# Altium footprint library PCB贴片元件封装库.pcblib: 366 footprints (part 20 of 23)
Each footprint in its own frame and in the unit in brackets; x right, y up, seen from the top. Pads: shape width x height; smd on the part's side, far side on the other; paste and mask are expansions set on the pad; w line width, h text height; cw(c..) or ccw(c..) is an arc to the next point about the centre after c.
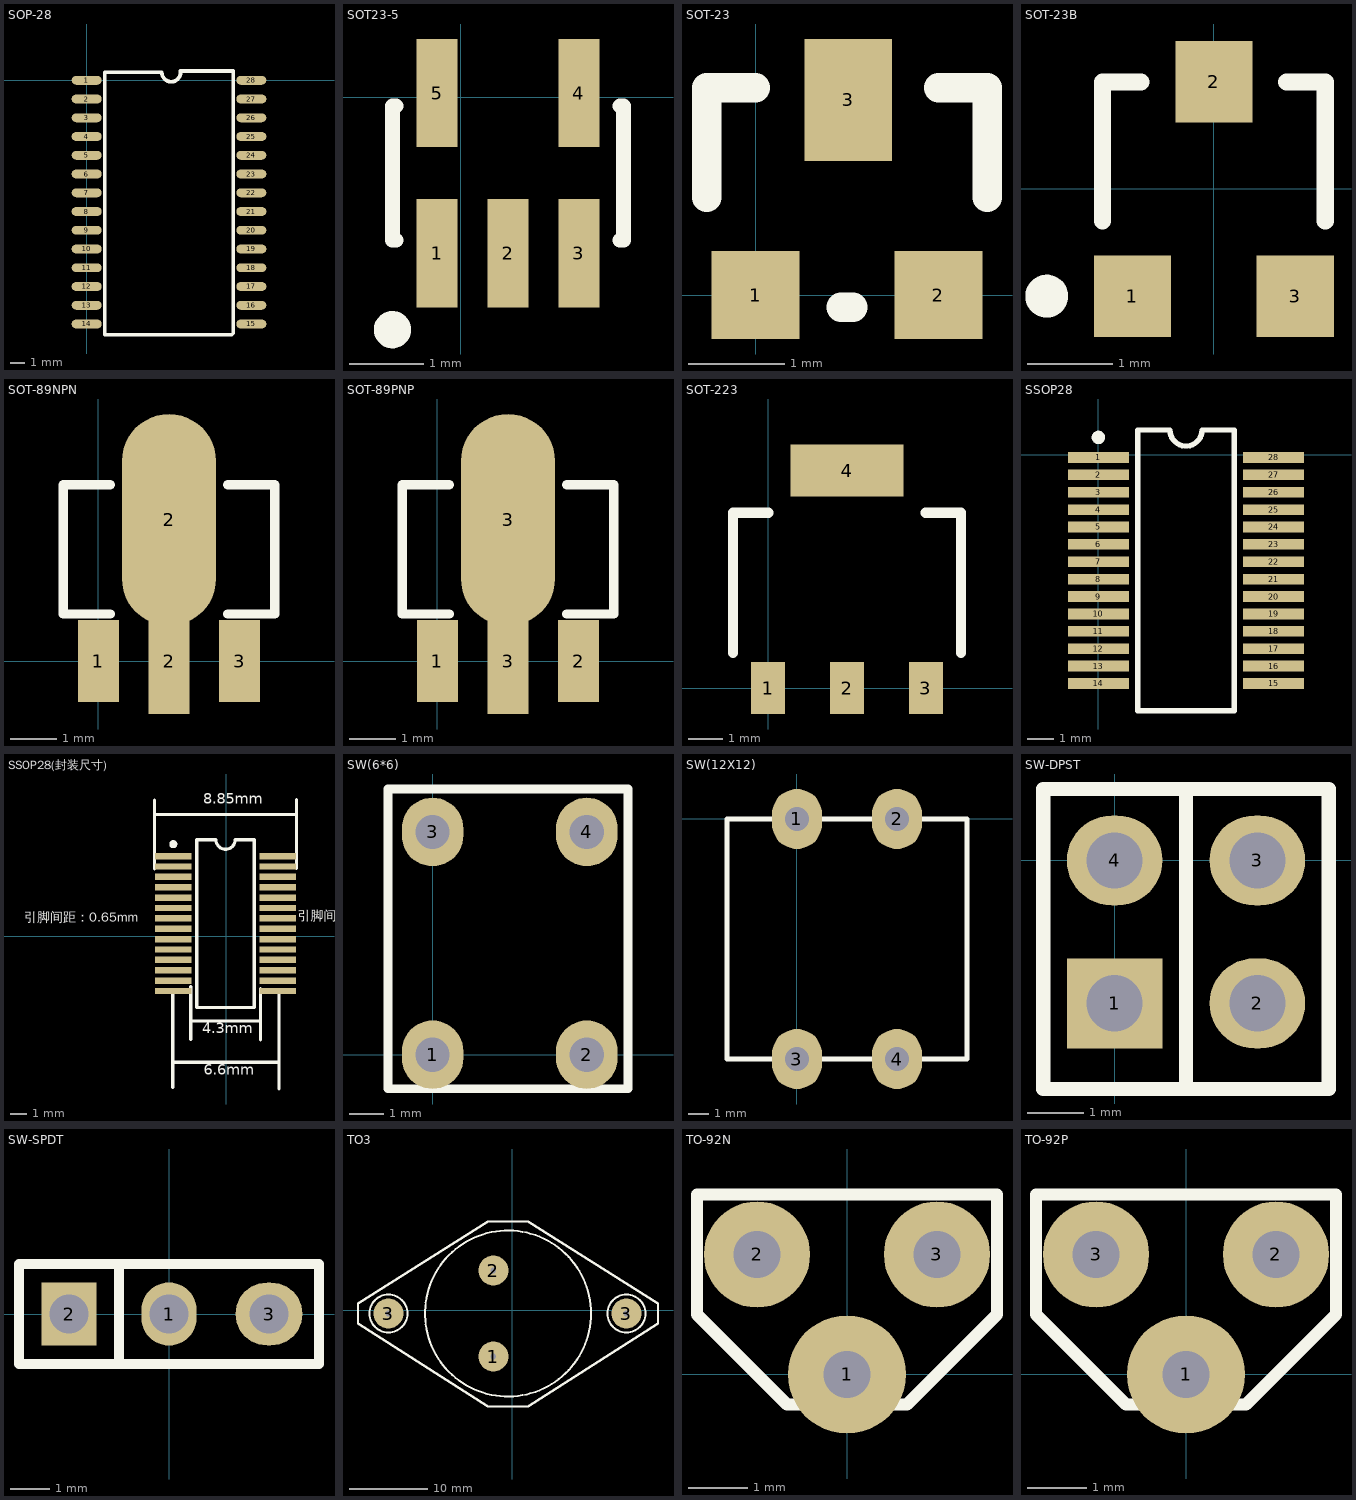
[diagram p19: the footprints below, top view; thin cyan lines are the x and y axes]

## SOP-28 [mil]
pads (28):
  oval 80x24 smd: 1(0,0) 2(0,-50) 3(0,-100) 4(0,-150) 5(0,-200) 6(0,-250) 7(0,-300) 8(0,-350) 9(0,-400) 10(0,-450) 11(0,-500) 12(0,-550) 13(0,-600) 14(0,-650) 15(439.29,-650) 16(439.29,-600) 17(439.29,-550) 18(439.29,-500) 19(439.29,-450) 20(439.29,-400) 21(439.29,-350) 22(439.29,-300) 23(439.29,-250) 24(439.29,-200) 25(439.29,-150) 26(439.29,-100) 27(439.29,-50) 28(439.29,0)
TopOverlay:
  lines w10: 196.61,21.06 48.19,21.06 48.19,-678.94 387.17,-678.94 ; 200.55,21.06 ccw(c225.55,21.06) 250.55,21.06 ; 250.55,25 391.1,25 391.1,-675

## SOT23-5 [mm]
pads (5):
  rect 0.55x1.45 smd: 1(-0.315,-2.091) 2(0.635,-2.091) 3(1.585,-2.091) 4(1.585,0.059) 5(-0.315,0.059)
TopOverlay:
  circle w0.25: c-0.915,-3.116 r0.125
  lines w0.2: -0.865,-1.916 -0.915,-1.916 -0.915,-0.116 -0.865,-0.116 ; 2.135,-1.916 2.185,-1.916 2.185,-0.116 2.135,-0.116

## SOT-23 [mil]
pads (3):
  rect 36x36 smd: 1(0,0) 2(75,0)
  rect 36x50 smd: 3(38,80)
TopOverlay:
  lines w12: -20,40 -20,85 0,85 ; 35,-5 40,-5 ; 75,85 95,85 95,40

## SOT-23B [mm] "SOT-23; 3 Leads; Body 3.0 x 2.6 mm, inc. leads (LxW max)"
height 1.1
pads (3):
  rect 0.9x0.95 smd: 1(-0.95,-1.25) 2(0,1.25) 3(0.95,-1.25)
TopOverlay:
  circle w0.25: c-1.95,-1.25 r0.125
  lines w0.2: -1.3,-0.375 -1.3,1.25 -0.85,1.25 ; 0.85,1.25 1.3,1.25 1.3,-0.375

## SOT-89NPN [mil]
pads (4):
  rect 35x70 smd: 1(0,0) 3(120,0)
  rect 35x90 smd: 2(60,0)
  oval 80x180 smd: 2(60,120)
TopOverlay:
  lines w8: 10,40 -30,40 -30,150 10,150 ; 110,40 150,40 150,150 110,150

## SOT-89PNP [mil]
pads (4):
  rect 35x70 smd: 1(0,0) 2(120,0)
  rect 35x90 smd: 3(60,0)
  oval 80x180 smd: 3(60,120)
TopOverlay:
  lines w8: 10,40 -30,40 -30,150 10,150 ; 110,40 150,40 150,150 110,150

## SOT-223 [mil]
pads (4):
  rect 39x59 smd: 1(0,0) 3(180,0)
  rect 38.98x59.05 smd: 2(90,0)
  rect 129.13x59 smd: 4(90,248.03)
TopOverlay:
  lines w11.81: -40,40 -40,200 0,200 ; 180,200 220,200 220,40

## SSOP28 [mil]
pads (28):
  rect 90x15.75 smd: 1(0.06,-3.66) 2(0.06,-29.25) 3(0.06,-54.84) 4(0.06,-80.43) 5(0.06,-106.02) 6(0.06,-131.61) 7(0.06,-157.2) 8(0.06,-182.8) 9(0.06,-208.39) 10(0.06,-233.98) 11(0.06,-259.57) 12(0.06,-285.16) 13(0.06,-310.75) 14(0.06,-336.34) 15(257.94,-336.34) 16(257.94,-310.75) 17(257.94,-285.16) 18(257.94,-259.57) 19(257.94,-233.98) 20(257.94,-208.39) 21(257.94,-182.8) 22(257.94,-157.2) 23(257.94,-131.61) 24(257.94,-106.02) 25(257.94,-80.43) 26(257.94,-54.84) 27(257.94,-29.25) 28(257.94,-3.66)
TopOverlay:
  circle w9.84: c0.06,25.87 r4.92
  lines w7.87: 58.13,-376.69 199.87,-376.69 199.87,36.69 152.62,36.69 cw(c129,36.69) 105.38,36.69 58.13,36.69 58.13,-376.69

## SSOP28(封装尺寸) [mil]
pads (28):
  rect 90x15.75 smd: 1(-130.94,197.34) 2(-130.94,171.75) 3(-130.94,146.16) 4(-130.94,120.57) 5(-130.94,94.98) 6(-130.94,69.39) 7(-130.94,43.8) 8(-130.94,18.2) 9(-130.94,-7.39) 10(-130.94,-32.98) 11(-130.94,-58.57) 12(-130.94,-84.16) 13(-130.94,-109.75) 14(-130.94,-135.34) 15(126.94,-135.34) 16(126.94,-109.75) 17(126.94,-84.16) 18(126.94,-58.57) 19(126.94,-32.98) 20(126.94,-7.39) 21(126.94,18.2) 22(126.94,43.8) 23(126.94,69.39) 24(126.94,94.98) 25(126.94,120.57) 26(126.94,146.16) 27(126.94,171.75) 28(126.94,197.34)
TopOverlay:
  circle w9.84: c-130.94,226.87 r4.92
  lines w7.87: -72.87,-175.69 68.87,-175.69 68.87,237.69 21.62,237.69 cw(c-2,237.69) -25.62,237.69 -72.87,237.69 -72.87,-175.69
  lines w8: -177,166 -177,336 ; -177,300 172,300 173,299 ; -132,-373 -132,-135 ; -132,-311 129,-311 130,-312 ; -88,-254 -88,-124 ; -88,-209 82,-209 84,-211 ; 84,-256 84,-129 ; 130,-377 130,-135 ; 173,167 173,337
  text "引脚间距：0.65mm" at -499,27 h40
  text "引脚间距：0.65mm" at 176,31 h40
  text "8.85mm" at -57,318 h45
  text "4.3mm" at -59,-248 h45
  text "6.6mm" at -56,-351 h45

## SW(6*6) [mm]
pads (4):
  oval 1.8x2 hole 1: 1(0,0) 2(4.5,0) 3(0,6.5) 4(4.5,6.5)
TopOverlay:
  lines w0.254: -1.3,-0.996 -1.3,7.754 5.7,7.754 5.7,-0.996 -1.3,-0.996

## SW(12X12) [mm]
pads (4):
  oval 2.5x3 hole 1.2: 1(0,0) 2(5,0) 3(0,-12) 4(5,-12)
TopOverlay:
  lines w0.25: -3.5,-12 8.5,-12 8.5,0 -3.5,0 -3.5,-12

## SW-DPST [mm]
pads (4):
  rect 1.7x1.6 hole 1: 1(0,-2.54)
  oval 1.7x1.6 hole 1: 2(2.54,-2.54) 3(2.54,0) 4(0,0)
TopOverlay:
  lines w0.254: 1.27,-4.064 1.27,1.27 ; -1.27,-4.064 -1.27,1.27 3.81,1.27 3.81,-4.064 -1.27,-4.064

## SW-SPDT [mm]
pads (3):
  oval 1.4x1.6 hole 1: 1(0,0)
  rect 1.4x1.6 hole 1: 2(-2.54,0)
  oval 1.7x1.6 hole 1: 3(2.54,0)
TopOverlay:
  lines w0.254: -1.27,-1.27 -1.27,1.27 ; -3.81,-1.27 -3.81,1.27 3.81,1.27 3.81,-1.27 -3.81,-1.27

## TO3 [mil]
pads (4):
  round 150 hole 28: 1(-94.33,-231.34) 2(-94.33,198.66) 3(-619.33,-16.34) 3(570.67,-16.34)
TopOverlay:
  circle w10: c-619.33,-16.34 r95
  circle w10: c570.67,-16.34 r95
  circle w10: c-21.33,-16.34 r415
  lines w12: -771.33,-66.34 -771.33,33.66 -121.33,443.66 78.67,443.66 728.67,33.66 728.67,-66.34 78.67,-481.34 -121.33,-481.34 -771.33,-66.34

## TO-92N [mm]
pads (3):
  round 2 hole 0.8: 1(0,0)
  round 1.8 hole 0.8: 2(-1.524,2.032) 3(1.524,2.032)
TopOverlay:
  lines w0.203: -2.54,1.016 -2.54,3.048 2.54,3.048 2.54,1.016 1.016,-0.508 -1.016,-0.508 -2.54,1.016

## TO-92P [mm]
pads (3):
  round 2 hole 0.8: 1(0,0)
  round 1.8 hole 0.8: 2(1.524,2.032) 3(-1.524,2.032)
TopOverlay:
  lines w0.203: -2.54,1.016 -2.54,3.048 2.54,3.048 2.54,1.016 1.016,-0.508 -1.016,-0.508 -2.54,1.016